# Altium footprint library X2安规电容.PcbLib: 22 footprints (part 2 of 2)
Each footprint in its own frame and in the unit in brackets; x right, y up, seen from the top. Pads: shape width x height; smd on the part's side, far side on the other; paste and mask are expansions set on the pad; w line width, h text height; cw(c..) or ccw(c..) is an arc to the next point about the centre after c.
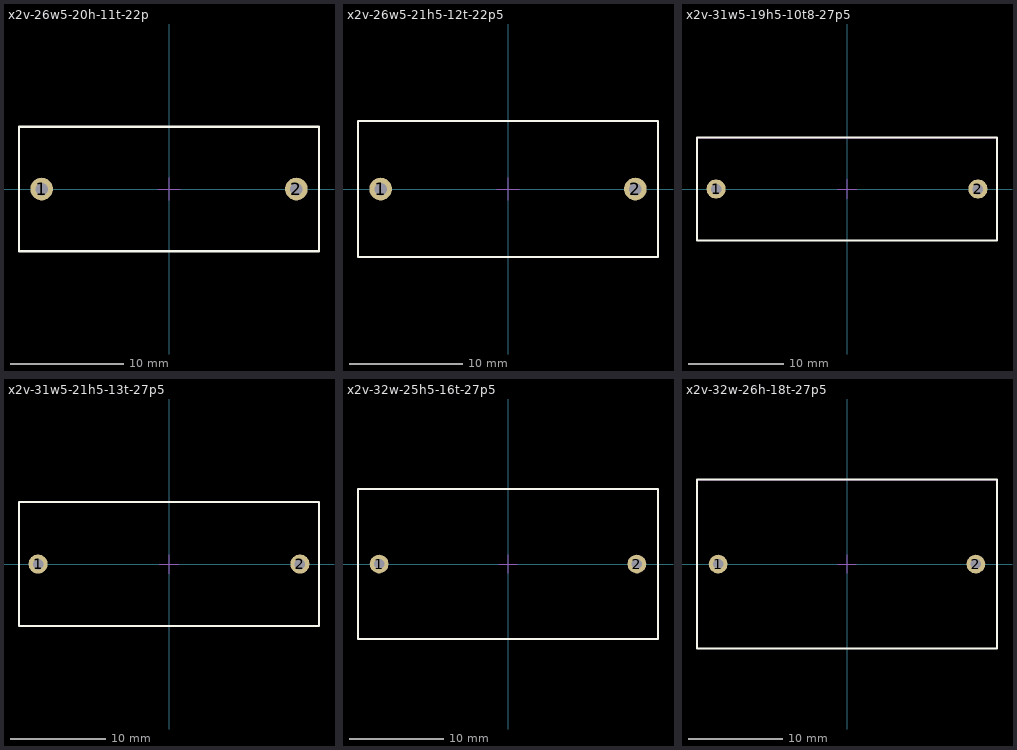
[diagram p1: the footprints below, top view; thin cyan lines are the x and y axes]

## x2v-26w5-20h-11t-22p [mm]
height 20
pads (2):
  round 2 hole 1.1: 1(-11.25,0) 2(11.25,0)
Top Overlay:
  lines w0.2: -13.25,-5.5 -13.25,5.505 13.25,5.505 13.25,-5.5 -13.25,-5.5
Mechanical 13:
  lines w0.05: -13.25,-5.5 -13.25,5.505 13.25,5.505 13.25,-5.5 -13.25,-5.5
Mechanical 15:
  lines w0.1: -1,0 1,0 ; 0,-1 0,1
3D body: height 20.01, standoff -3.99, extent -13.25,-5.5 13.25,5.505

## x2v-26w5-21h5-12t-22p5 [mm]
height 21.5
pads (2):
  round 2 hole 1.1: 1(-11.25,0) 2(11.25,0)
Top Overlay:
  lines w0.2: -13.25,-6 -13.25,6.005 13.25,6.005 13.25,-6 -13.25,-6
Mechanical 13:
  lines w0.05: -13.25,-6 -13.25,6.005 13.25,6.005 13.25,-6 -13.25,-6
Mechanical 15:
  lines w0.1: -1,0 1,0 ; 0,-1 0,1
3D body: height 21.51, standoff -3.99, extent -13.25,-6 13.25,6.005

## x2v-31w5-19h5-10t8-27p5 [mm]
height 19.5
pads (2):
  round 2 hole 1.1: 1(-13.75,0) 2(13.75,0)
Top Overlay:
  lines w0.2: -15.75,-5.4 -15.75,5.405 15.75,5.405 15.75,-5.4 -15.75,-5.4
Mechanical 13:
  lines w0.05: -15.75,-5.4 -15.75,5.405 15.75,5.405 15.75,-5.4 -15.75,-5.4
Mechanical 15:
  lines w0.1: -1,0 1,0 ; 0,-1 0,1
3D body: height 19.51, standoff -3.99, extent -15.75,-5.4 15.75,5.405

## x2v-31w5-21h5-13t-27p5 [mm]
height 21.5
pads (2):
  round 2 hole 1.1: 1(-13.75,0) 2(13.75,0)
Top Overlay:
  lines w0.2: -15.75,-6.5 -15.75,6.51 15.75,6.51 15.75,-6.5 -15.75,-6.5
Mechanical 13:
  lines w0.05: -15.75,-6.5 -15.75,6.51 15.75,6.51 15.75,-6.5 -15.75,-6.5
Mechanical 15:
  lines w0.1: -1,0 1,0 ; 0,-1 0,1
3D body: height 21.51, standoff -3.99, extent -15.75,-6.5 15.75,6.51

## x2v-32w-25h5-16t-27p5 [mm]
height 25.5
pads (2):
  round 2 hole 1.1: 1(-13.75,0) 2(13.75,0)
Top Overlay:
  lines w0.2: -16.002,-8 -16.002,8.01 16.002,8.01 16.002,-8 -16.002,-8
Mechanical 13:
  lines w0.05: -16.002,-8 -16.002,8.01 16.002,8.01 16.002,-8 -16.002,-8
Mechanical 15:
  lines w0.1: -1,0 1,0 ; 0,-1 0,1
3D body: height 25.51, standoff -3.99, extent -16,-8 16,8.01

## x2v-32w-26h-18t-27p5 [mm]
height 26
pads (2):
  round 2 hole 1.1: 1(-13.75,0) 2(13.75,0)
Top Overlay:
  lines w0.2: -16.002,-9 16.002,-9 16.002,9.01 -16.002,9.01 -16.002,-9
Mechanical 13:
  lines w0.05: -16.002,-9 16.002,-9 16.002,9.017 -16.002,9.017 -16.002,-9
Mechanical 15:
  lines w0.1: -1,0 1,0 ; 0,-1 0,1
3D body: height 26.01, standoff -3.99, extent -16,-9 16,9.01